# Altium footprint library Capacitors.PcbLib: 240 footprints (part 15 of 15)
Each footprint in its own frame and in the unit in brackets; x right, y up, seen from the top. Pads: shape width x height; smd on the part's side, far side on the other; paste and mask are expansions set on the pad; w line width, h text height; cw(c..) or ccw(c..) is an arc to the next point about the centre after c.
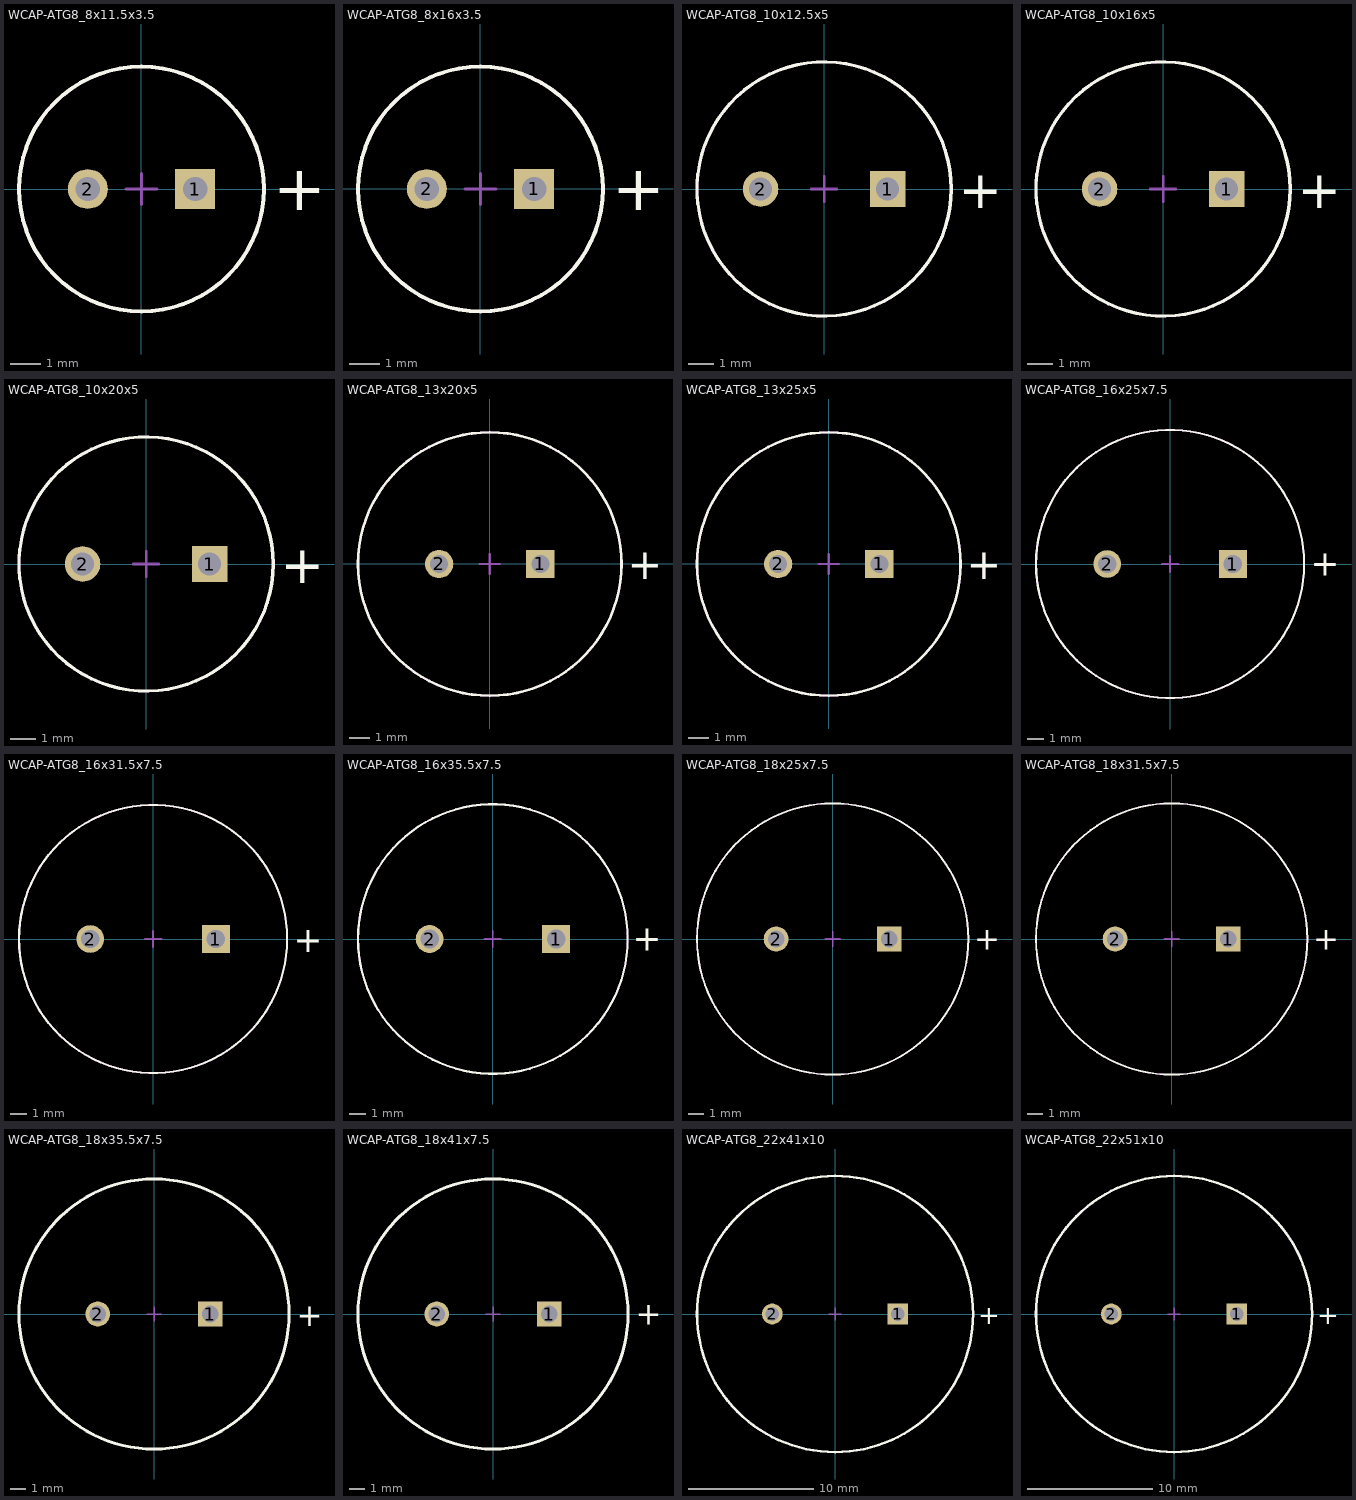
[diagram p14: the footprints below, top view; thin cyan lines are the x and y axes]

## WCAP-ATG8_8x11.5x3.5 [mm] "Aluminum Electrolytic Capacitors, 8x11.5mm"
height 11.5
pads (2):
  rect 1.3x1.3 hole 0.8: 1(1.75,0)
  round 1.3 hole 0.8: 2(-1.75,0)
Top Overlay:
  circle w0.127: c0,0 r4
  text "+" at 4.3,-0.7 h1.5
Mechanical 13:
  circle w0.1: c0,0 r4
Mechanical 15:
  lines w0.1: -0.5,0 0.5,0 ; 0,-0.5 0,0.5
3D body "8x11.5x3.5x0.5.stp": height 11.81, standoff -19.91, extent -3.99,-4 4,3.999

## WCAP-ATG8_8x16x3.5 [mm] "Aluminum Electrolytic Capacitors, 8x16mm"
height 16
pads (2):
  rect 1.3x1.3 hole 0.8: 1(1.75,0)
  round 1.3 hole 0.8: 2(-1.75,0)
Top Overlay:
  circle w0.127: c0,0 r4
  text "+" at 4.3,-0.7 h1.5
Mechanical 13:
  circle w0.1: c0,0 r4
Mechanical 15:
  lines w0.1: -0.5,0 0.5,0 ; 0,-0.5 0,0.5
3D body "8x16x3.5x0.5.stp": height 16.31, standoff -19.91, extent -3.99,-4 4,3.999

## WCAP-ATG8_10x12.5x5 [mm] "Aluminum Electrolytic Capacitors, 10x12.5mm"
height 12.5
pads (2):
  rect 1.4x1.4 hole 0.9: 1(2.5,0)
  round 1.4 hole 0.9: 2(-2.5,0)
Top Overlay:
  circle w0.127: c0,0 r5
  text "+" at 5.3,-0.75 h1.5
Mechanical 13:
  circle w0.1: c0,0 r5
Mechanical 15:
  lines w0.1: -0.5,0 0.5,0 ; 0,-0.5 0,0.5
3D body "10x12.5x5x0.6.stp": height 12.81, standoff -19.91, extent -4.99,-5 5,5

## WCAP-ATG8_10x16x5 [mm] "Aluminum Electrolytic Capacitors, 10x16mm"
height 16
pads (2):
  rect 1.4x1.4 hole 0.9: 1(2.5,0)
  round 1.4 hole 0.9: 2(-2.5,0)
Top Overlay:
  circle w0.127: c0,0 r5
  text "+" at 5.3,-0.75 h1.5
Mechanical 13:
  circle w0.1: c0,0 r5
Mechanical 15:
  lines w0.1: -0.5,0 0.5,0 ; 0,-0.5 0,0.5
3D body "10x16x5x0.6.stp": height 16.31, standoff -19.91, extent -4.99,-5 5,4.999

## WCAP-ATG8_10x20x5 [mm] "Aluminum Electrolytic Capacitors, 10x20mm"
height 20
pads (2):
  rect 1.4x1.4 hole 0.9: 1(2.5,0)
  round 1.4 hole 0.9: 2(-2.5,0)
Top Overlay:
  circle w0.127: c0,0 r5
  text "+" at 5.3,-0.75 h1.5
Mechanical 13:
  circle w0.1: c0,0 r5
Mechanical 15:
  lines w0.1: -0.5,0 0.5,0 ; 0,-0.5 0,0.5
3D body "10x20x5x0.6.stp": height 20.31, standoff -19.91, extent -4.99,-5 5,4.999

## WCAP-ATG8_13x20x5 [mm] "Aluminum Electrolytic Capacitors, 13x20mm"
height 20
pads (2):
  rect 1.4x1.4 hole 0.9: 1(2.5,0)
  round 1.4 hole 0.9: 2(-2.5,0)
Top Overlay:
  circle w0.127: c0,0 r6.5
  text "+" at 6.8,-0.75 h1.5
Mechanical 13:
  circle w0.1: c0,0 r6.5
Mechanical 15:
  lines w0.1: -0.5,0 0.5,0 ; 0,-0.5 0,0.5
3D body "13x20x5x0.6.stp": height 20.31, standoff -19.91, extent -6.49,-6.5 6.5,6.5

## WCAP-ATG8_13x25x5 [mm] "Aluminum Electrolytic Capacitors, 13x25mm"
height 25
pads (2):
  rect 1.4x1.4 hole 0.9: 1(2.5,0)
  round 1.4 hole 0.9: 2(-2.5,0)
Top Overlay:
  circle w0.127: c0,0 r6.5
  text "+" at 6.8,-0.75 h1.5
Mechanical 13:
  circle w0.1: c0,0 r6.5
Mechanical 15:
  lines w0.1: -0.5,0 0.5,0 ; 0,-0.5 0,0.5
3D body "13x25x5x0.6.stp": height 25.31, standoff -19.91, extent -6.49,-6.5 6.5,6.5

## WCAP-ATG8_16x25x7.5 [mm] "Aluminum Electrolytic Capacitors, 16x25mm"
height 25
pads (2):
  rect 1.65x1.65 hole 1.1: 1(3.75,0)
  round 1.65 hole 1.1: 2(-3.75,0)
Top Overlay:
  circle w0.127: c0,0 r8
  text "+" at 8.4,-0.7 h1.5
Mechanical 13:
  circle w0.1: c0,0 r8
Mechanical 15:
  lines w0.1: -0.5,0 0.5,0 ; 0,-0.5 0,0.5
3D body "16x25x7.5x0.8.stp": height 25.31, standoff -19.91, extent -7.99,-8 8,7.999

## WCAP-ATG8_16x31.5x7.5 [mm] "Aluminum Electrolytic Capacitors, 16x31.5mm"
height 31.5
pads (2):
  rect 1.65x1.65 hole 1.1: 1(3.75,0)
  round 1.65 hole 1.1: 2(-3.75,0)
Top Overlay:
  circle w0.127: c0,0 r8
  text "+" at 8.4,-0.8 h1.5
Mechanical 13:
  circle w0.1: c0,0 r8
Mechanical 15:
  lines w0.1: -0.5,0 0.5,0 ; 0,-0.5 0,0.5
3D body "16x31.5x7.5x0.8.stp": height 31.81, standoff -19.91, extent -7.99,-7.997 8,7.998

## WCAP-ATG8_16x35.5x7.5 [mm] "Aluminum Electrolytic Capacitors, 16x35.5mm"
height 35.5
pads (2):
  rect 1.65x1.65 hole 1.1: 1(3.75,0)
  round 1.65 hole 1.1: 2(-3.75,0)
Top Overlay:
  circle w0.127: c0,0 r8
  text "+" at 8.3,-0.7 h1.5
Mechanical 13:
  circle w0.1: c0,0 r8
Mechanical 15:
  lines w0.1: -0.5,0 0.5,0 ; 0,-0.5 0,0.5
3D body "16x35.5x7.5x0.8.stp": height 35.81, standoff -19.91, extent -7.99,-7.999 8,7.999

## WCAP-ATG8_18x25x7.5 [mm] "Aluminum Electrolytic Capacitors, 18x25mm"
height 25
pads (2):
  rect 1.65x1.65 hole 1.1: 1(3.75,0)
  round 1.65 hole 1.1: 2(-3.75,0)
Top Overlay:
  circle w0.127: c0,0 r9
  text "+" at 9.4,-0.7 h1.5
Mechanical 13:
  circle w0.1: c0,0 r9
Mechanical 15:
  lines w0.1: -0.5,0 0.5,0 ; 0,-0.5 0,0.5
3D body "18x25x7.5x0.8.stp": height 25.31, standoff -19.91, extent -8.99,-9 9,9

## WCAP-ATG8_18x31.5x7.5 [mm] "Aluminum Electrolytic Capacitors, 18x31.5mm"
height 31.5
pads (2):
  rect 1.65x1.65 hole 1.1: 1(3.75,0)
  round 1.65 hole 1.1: 2(-3.75,0)
Top Overlay:
  circle w0.127: c0,0 r9
  text "+" at 9.4,-0.7 h1.5
Mechanical 13:
  circle w0.1: c0,0 r9
Mechanical 15:
  lines w0.1: -0.5,0 0.5,0 ; 0,-0.5 0,0.5
3D body "18x31.5x7.5x0.8.stp": height 31.81, standoff -19.94, extent -8.99,-9 9,9

## WCAP-ATG8_18x35.5x7.5 [mm] "Aluminum Electrolytic Capacitors, 18x35.5mm"
height 35.5
pads (2):
  rect 1.65x1.65 hole 1.1: 1(3.75,0)
  round 1.65 hole 1.1: 2(-3.75,0)
Top Overlay:
  circle w0.2: c0,0 r9
  text "+" at 9.5,-0.8 h1.5
Mechanical 13:
  circle w0.1: c0,0 r9
Mechanical 15:
  lines w0.1: -0.5,0 0.5,0 ; 0,-0.5 0,0.5
3D body "18x35.5x7.5x0.8.stp": height 35.81, standoff -19.91, extent -8.99,-8.997 9,8.997

## WCAP-ATG8_18x41x7.5 [mm] "Aluminum Electrolytic Capacitors, 18x41mm"
height 41
pads (2):
  rect 1.65x1.65 hole 1.1: 1(3.75,0)
  round 1.65 hole 1.1: 2(-3.75,0)
Top Overlay:
  circle w0.2: c0,0 r9
  text "+" at 9.5,-0.7 h1.5
Mechanical 13:
  circle w0.1: c0,0 r9
Mechanical 15:
  lines w0.1: -0.5,0 0.5,0 ; 0,-0.5 0,0.5
3D body "18x41x7.5x0.8.stp": height 41.31, standoff -19.91, extent -8.99,-9 9,8.999

## WCAP-ATG8_22x41x10 [mm] "Aluminum Electrolytic Capacitors, 22x41mm"
height 41
pads (2):
  rect 1.65x1.65 hole 1.1: 1(5,0)
  round 1.65 hole 1.1: 2(-5,0)
Top Overlay:
  circle w0.2: c0,0 r11
  text "+" at 11.4,-0.8 h1.5
Mechanical 13:
  circle w0.1: c0,0 r11
Mechanical 15:
  lines w0.1: -0.5,0 0.5,0 ; 0,-0.5 0,0.5
3D body "22x41x10x0.8.stp": height 41.31, standoff -19.91, extent -10.99,-11 11,10.996

## WCAP-ATG8_22x51x10 [mm] "Aluminum Electrolytic Capacitors, 22x51mm"
height 51
pads (2):
  rect 1.65x1.65 hole 1.1: 1(5,0)
  round 1.65 hole 1.1: 2(-5,0)
Top Overlay:
  circle w0.2: c0,0 r11
  text "+" at 11.4,-0.8 h1.5
Mechanical 13:
  circle w0.1: c0,0 r11
Mechanical 15:
  lines w0.1: -0.5,0 0.5,0 ; 0,-0.5 0,0.5
3D body "22x51x10x0.8.stp": height 51.31, standoff -19.91, extent -10.99,-10.997 11,10.997